# Altium footprint library Connektor.PcbLib: 305 footprints (part 4 of 20)
Each footprint in its own frame and in the unit in brackets; x right, y up, seen from the top. Pads: shape width x height; smd on the part's side, far side on the other; paste and mask are expansions set on the pad; w line width, h text height; cw(c..) or ccw(c..) is an arc to the next point about the centre after c.
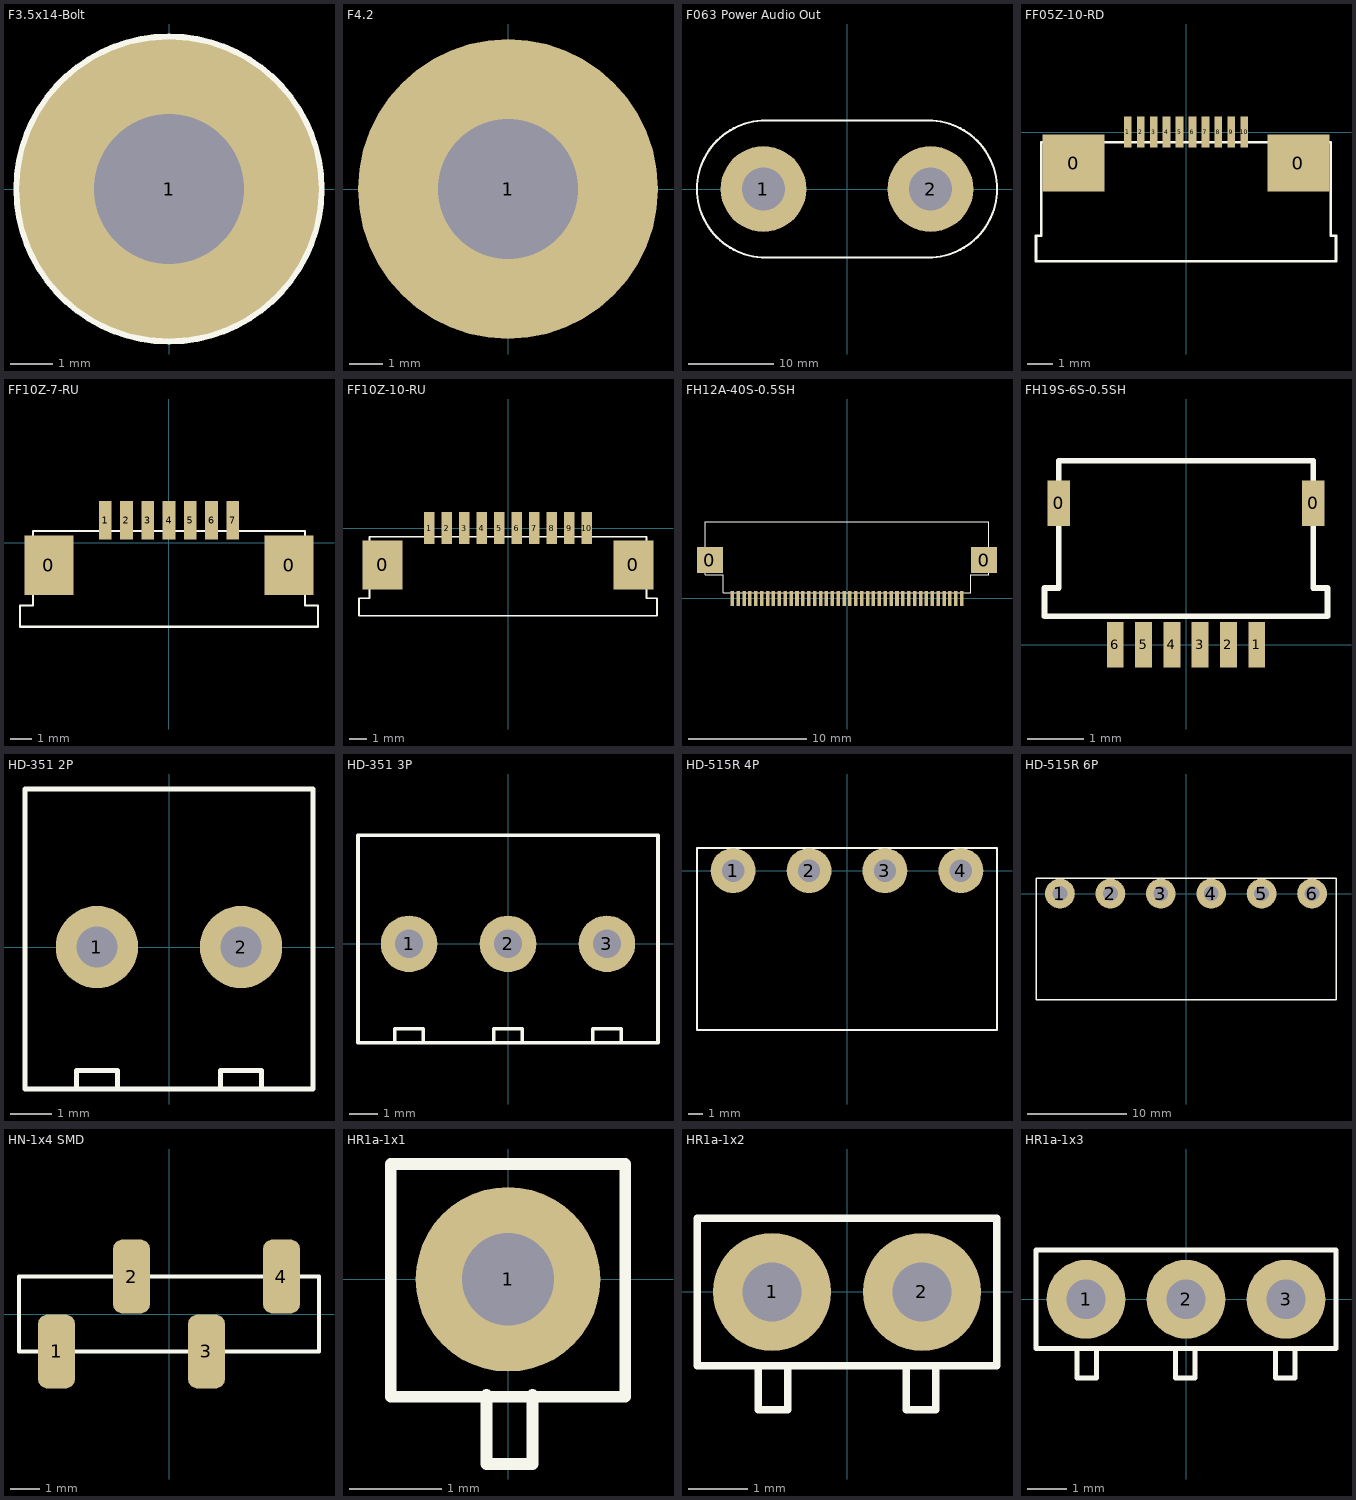
[diagram p3: the footprints below, top view; thin cyan lines are the x and y axes]

## F3.5x14-Bolt [mm]
pads (1):
  round 7 hole 3.5: 1(0,0)
TopOverlay:
  circle w0.254: c0,0 r3.5
3D body: height 12.5, standoff -3.5, extent -3,-3 3,3

## F4.2 [mm]
pads (1):
  round 9 hole 4.2: 1(0,0)
3D body: height 1, standoff 0, extent -4.5,-4.5 4.5,4.5
3D body: height 7.5, standoff -5.3, extent -4,-4 4,4

## F063 Power Audio Out [mm]
pads (2):
  round 10 hole 5: 1(-9.75,0) 2(9.75,0)
TopOverlay:
  lines w0.254: -17.5,0 ccw(c-9.5,0) -9.5,-8 9.5,-8 ccw(c9.5,0) 17.5,0 ccw(c9.5,0) 9.5,8 -9.5,8 ccw(c-9.5,0) -17.5,0
3D body: height 43.06, standoff -9.37, extent -18.132,-8.382 17.682,8.382

## FF05Z-10-RD [mm]
pads (12):
  rect 2.4x2.2 smd: 0(-4.35,-1.2) 0(4.35,-1.2)
  rect 0.3x1.2 smd: 1(-2.25,0) 2(-1.75,0) 3(-1.25,0) 4(-0.75,0) 5(-0.25,0) 6(0.25,0) 7(0.75,0) 8(1.25,0) 9(1.75,0) 10(2.25,0)
TopOverlay:
  lines w0.1: -5.8,-5 5.8,-5 5.8,-4 5.6,-4 5.6,-0.4 -5.6,-0.4 -5.6,-4 -5.8,-4 -5.8,-5
3D body: height 2, standoff 0, extent -5.8,-5 5.8,-0.4

## FF10Z-7-RU [mm]
pads (9):
  rect 2.3x2.8 smd: 0(-5.65,-1.05) 0(5.65,-1.05)
  rect 0.6x1.8 smd: 1(-3,1.05) 2(-2,1.05) 3(-1,1.05) 4(0,1.05) 5(1,1.05) 6(2,1.05) 7(3,1.05)
TopOverlay:
  lines w0.1: -7,-3.95 -7,-2.95 -6.4,-2.95 -6.4,0.55 6.4,0.55 6.4,-2.95 7,-2.95 7,-3.95 -7,-3.95
3D body: height 3, standoff 0, extent -7,-6.2 7,2.5

## FF10Z-10-RU [mm]
pads (12):
  rect 2.3x2.8 smd: 0(-7.15,-2.1) 0(7.15,-2.1)
  rect 0.6x1.8 smd: 1(-4.5,0) 2(-3.5,0) 3(-2.5,0) 4(-1.5,0) 5(-0.5,0) 6(0.5,0) 7(1.5,0) 8(2.5,0) 9(3.5,0) 10(4.5,0)
TopOverlay:
  lines w0.1: -8.5,-5 -8.5,-4 -7.9,-4 -7.9,-0.5 7.9,-0.5 7.9,-4 8.5,-4 8.5,-5 -8.5,-5

## FH12A-40S-0.5SH [mm]
pads (42):
  rect 2.2x2.2 smd: 0(-11.65,3.25) 0(11.65,3.25)
  rect 0.3x1.3 smd: 1(-9.75,0) 2(-9.25,0) 3(-8.75,0) 4(-8.25,0) 5(-7.75,0) 6(-7.25,0) 7(-6.75,0) 8(-6.25,0) 9(-5.75,0) 10(-5.25,0) 11(-4.75,0) 12(-4.25,0) 13(-3.75,0) 14(-3.25,0) 15(-2.75,0) 16(-2.25,0) 17(-1.75,0) 18(-1.25,0) 19(-0.75,0) 20(-0.25,0) 21(0.25,0) 22(0.75,0) 23(1.25,0) 24(1.75,0) 25(2.25,0) 26(2.75,0) 27(3.25,0) 28(3.75,0) 29(4.25,0) 30(4.75,0) 31(5.25,0) 32(5.75,0) 33(6.25,0) 34(6.75,0) 35(7.25,0) 36(7.75,0) 37(8.25,0) 38(8.75,0) 39(9.25,0) 40(9.75,0)
TopOverlay:
  lines w0.1: -12.05,2 -12.05,6.499 12.05,6.499 12.05,2 10.5,2 10.5,0.5 -10.5,0.5 -10.5,2 -12.05,2
3D body: height 2.2, standoff -0.05, extent -12.05,0 12.05,6.499

## FH19S-6S-0.5SH [mm]
pads (8):
  rect 0.4x0.8 smd: 0(-2.25,2.5) 0(2.25,2.5)
  rect 0.3x0.8 smd: 1(1.25,0) 2(0.75,0) 3(0.25,0) 4(-0.25,0) 5(-0.75,0) 6(-1.25,0)
TopOverlay:
  lines w0.1: -2.5,0.5 2.5,0.5 2.5,1 2.25,1 2.25,3.25 -2.25,3.25 -2.25,1 -2.5,1 -2.5,0.5

## HD-351 2P [mm]
pads (2):
  round 2 hole 1: 1(-1.75,0) 2(1.75,0)
TopOverlay:
  lines w0.127: -2.25,-3.45 -2.25,-3 -1.25,-3 -1.25,-3.45 ; 1.25,-3.45 1.25,-3 2.25,-3 2.25,-3.45 ; -3.5,-3.45 -3.5,3.84 3.5,3.84 3.5,-3.45 -3.5,-3.45
3D body: height 8.51, standoff -3.5, extent -3.553,-3.45 3.559,3.84

## HD-351 3P [mm]
pads (3):
  round 2 hole 1: 1(-3.5,0) 2(0,0) 3(3.5,0)
TopOverlay:
  lines w0.127: -4,-3.5 -4,-3 -3,-3 -3,-3.5 ; -0.5,-3.5 -0.5,-3 0.5,-3 0.5,-3.5 ; 3,-3.5 3,-3 4,-3 4,-3.5 ; -5.306,-3.5 5.306,-3.5 5.306,3.84 -5.306,3.84 -5.306,-3.5
3D body: height 8.51, standoff -3.5, extent -1.803,-3.45 5.309,3.84
3D body: height 8.51, standoff -3.5, extent -5.303,-3.45 1.809,3.84

## HD-515R 4P [mm]
pads (4):
  round 3 hole 1.5: 1(-7.62,0) 2(-2.54,0) 3(2.54,0) 4(7.62,0)
TopOverlay:
  lines w0.127: -10.033,-10.668 10.033,-10.668 10.033,1.524 -10.033,1.524 -10.033,-10.668

## HD-515R 6P [mm]
pads (6):
  round 3 hole 1.5: 1(-12.7,0) 2(-7.62,0) 3(-2.54,0) 4(2.54,0) 5(7.62,0) 6(12.7,0)
TopOverlay:
  lines w0.127: -15.113,-10.668 15.113,-10.668 15.113,1.524 -15.113,1.524 -15.113,-10.668

## HN-1x4 SMD [mm]
pads (4):
  rrect50% 1.25x2.5 smd: 1(-3.81,-1.27) 2(-1.27,1.27) 3(1.27,-1.27) 4(3.81,1.27)
TopOverlay:
  lines w0.125: -5.08,-1.27 5.08,-1.27 5.08,1.27 -5.08,1.27 -5.08,-1.27
3D body: height 8.83, standoff 0.01, extent -5.08,-2.424 5.08,2.425

## HR1a-1x1 [mm]
pads (1):
  round 2 hole 1: 1(0,0)
TopOverlay:
  lines w0.127: -0.234,-1.25 -0.234,-2 0.266,-2 0.266,-1.25 ; -1.27,-1.27 1.27,-1.27 1.27,1.25 -1.27,1.25 -1.27,-1.27
3D body: height 5.41, standoff -2.5, extent -1.27,-7 1.27,1.27

## HR1a-1x2 [mm]
pads (2):
  round 2 hole 1: 1(-1.27,0) 2(1.27,0)
TopOverlay:
  lines w0.127: -1.504,-1.25 -1.504,-2 -1.004,-2 -1.004,-1.25 ; 1.004,-1.25 1.004,-2 1.504,-2 1.504,-1.25 ; -2.54,-1.25 -2.54,1.25 2.54,1.25 2.54,-1.25 -2.54,-1.25
3D body: height 5.41, standoff -2.5, extent -2.54,-7 2.54,1.27

## HR1a-1x3 [mm]
pads (3):
  round 2 hole 1: 1(-2.54,0) 2(0,0) 3(2.54,0)
TopOverlay:
  lines w0.127: -2.774,-1.25 -2.774,-2 -2.274,-2 -2.274,-1.25 ; -0.266,-1.25 -0.266,-2 0.234,-2 0.234,-1.25 ; 2.274,-1.25 2.274,-2 2.774,-2 2.774,-1.25 ; -3.81,-1.25 -3.81,1.25 3.81,1.25 3.81,-1.25 -3.81,-1.25
3D body: height 5.41, standoff -2.5, extent -3.81,-7 3.81,1.27